# Altium footprint library pcb.PcbLib: 397 footprints (part 16 of 25)
Each footprint in its own frame and in the unit in brackets; x right, y up, seen from the top. Pads: shape width x height; smd on the part's side, far side on the other; paste and mask are expansions set on the pad; w line width, h text height; cw(c..) or ccw(c..) is an arc to the next point about the centre after c.
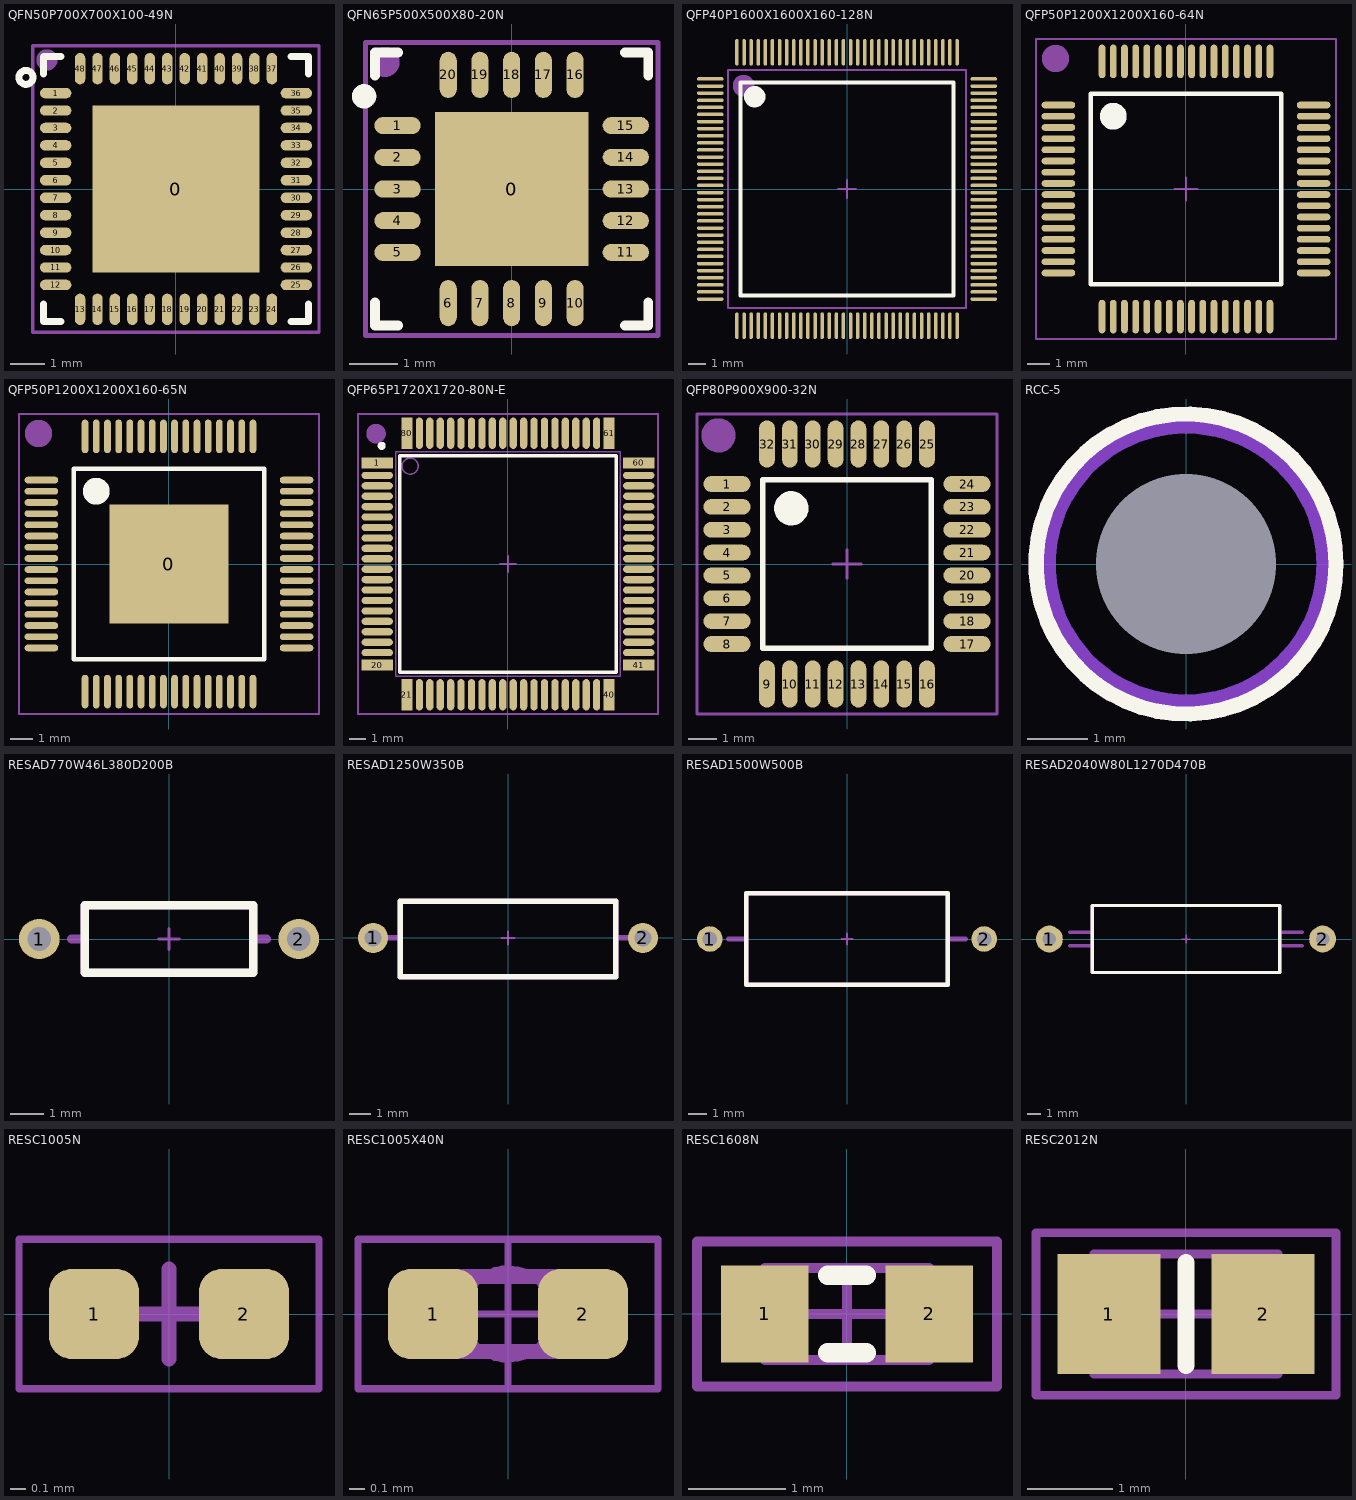
[diagram p15: the footprints below, top view; thin cyan lines are the x and y axes]

## QFN50P700X700X100-49N [mm] "QFN,0.50mm pitch,square;48 pin,7.00mm L X 7.00mm W X 1.0mm H body (w/thermal tab)"
height 0.8
pads (49):
  rect 4.8x4.8 smd paste-50: 0(0,0)
  oval 0.9x0.3 smd paste-0.03 mask+0.07: 1(-3.45,2.75) 2(-3.45,2.25) 3(-3.45,1.75) 4(-3.45,1.25) 5(-3.45,0.75) 6(-3.45,0.25) 7(-3.45,-0.25) 8(-3.45,-0.75) 9(-3.45,-1.25) 10(-3.45,-1.75) 11(-3.45,-2.25) 12(-3.45,-2.75) 25(3.45,-2.75) 26(3.45,-2.25) 27(3.45,-1.75) 28(3.45,-1.25) 29(3.45,-0.75) 30(3.45,-0.25) 31(3.45,0.25) 32(3.45,0.75) 33(3.45,1.25) 34(3.45,1.75) 35(3.45,2.25) 36(3.45,2.75)
  oval 0.3x0.9 smd paste-0.03 mask+0.07: 13(-2.75,-3.45) 14(-2.25,-3.45) 15(-1.75,-3.45) 16(-1.25,-3.45) 17(-0.75,-3.45) 18(-0.25,-3.45) 19(0.25,-3.45) 20(0.75,-3.45) 21(1.25,-3.45) 22(1.75,-3.45) 23(2.25,-3.45) 24(2.75,-3.45) 37(2.75,3.45) 38(2.25,3.45) 39(1.75,3.45) 40(1.25,3.45) 41(0.75,3.45) 42(0.25,3.45) 43(-0.25,3.45) 44(-0.75,3.45) 45(-1.25,3.45) 46(-1.75,3.45) 47(-2.25,3.45) 48(-2.75,3.45)
Top Overlay:
  circle w0.2: c-4.3,3.2 r0.2
  lines w0.2: -3.8,-3.3 -3.8,-3.8 -3.3,-3.8 ; -3.8,3.3 -3.8,3.8 -3.3,3.8 ; 3.3,-3.8 3.8,-3.8 3.8,-3.3 ; 3.3,3.8 3.8,3.8 3.8,3.3
Top Paste:
  region: -0.3,-2.3 -0.3,-0.3 -2.3,-0.3 -2.3,-2.3
  region: 2.3,-0.3 0.3,-0.3 0.3,-2.3 2.3,-2.3
  rectangle: 0.3,0.3 2.3,2.3
  rectangle: -2.3,0.3 -0.3,2.3
Mechanical 15:
  circle w0.406: c-3.7,3.7 r0.1
  lines w0.1: -0.3,0 0.3,0 ; 0,-0.3 0,0.3 ; -4.1,-4.1 -4.1,4.1 4.1,4.1 4.1,-4.1 -4.1,-4.1
  text ".Designator" at -3.8,-3.6 h1.02
3D body: height 1, standoff 0, extent -3.6,-3.6 3.6,3.6

## QFN65P500X500X80-20N [mm] "QFN, 20-Leads, Body 5.1x5.1mm (max), Pitch 0.65mm, IPC Medium Density"
height 0.8
pads (21):
  rect 3.15x3.15 smd paste-1000: 0(0,0)
  oval 0.95x0.35 smd: 1(-2.34,1.3) 2(-2.34,0.65) 3(-2.34,0) 4(-2.34,-0.65) 5(-2.34,-1.3) 11(2.34,-1.3) 12(2.34,-0.65) 13(2.34,0) 14(2.34,0.65) 15(2.34,1.3)
  oval 0.35x0.95 smd: 6(-1.3,-2.34) 7(-0.65,-2.34) 8(0,-2.34) 9(0.65,-2.34) 10(1.3,-2.34) 16(1.3,2.34) 17(0.65,2.34) 18(0,2.34) 19(-0.65,2.34) 20(-1.3,2.34)
Top Overlay:
  circle w0.25: c-3.025,1.9 r0.125
  lines w0.2: -2.8,-2.325 -2.8,-2.8 -2.325,-2.8 ; -2.8,2.325 -2.8,2.8 -2.325,2.8 ; 2.325,-2.8 2.8,-2.8 2.8,-2.325 ; 2.325,2.8 2.8,2.8 2.8,2.325
Top Paste:
  rectangle: -1.4,0.2 -0.2,1.4
  rectangle: 0.2,0.2 1.4,1.4
  rectangle: 0.2,-1.4 1.4,-0.2
  rectangle: -1.4,-1.4 -0.2,-0.2
Mechanical 15:
  circle w0.406: c-2.6,2.6 r0.1
  lines w0.1: -0.3,0 0.3,0 ; 0,-0.3 0,0.3 ; -3,-3 -3,3 3,3 3,-3 -3,-3
  text ".Designator" at -2.6,-2.4 h1.02
3D body: height 0.8, standoff 0.05, extent -2.55,-2.55 2.55,2.55

## QFP40P1600X1600X160-128N [mm]
height 1.6
pads (128):
  oval 1.5x0.2 smd: 1(-7.7,6.2) 2(-7.7,5.8) 3(-7.7,5.4) 4(-7.7,5) 5(-7.7,4.6) 6(-7.7,4.2) 7(-7.7,3.8) 8(-7.7,3.4) 9(-7.7,3) 10(-7.7,2.6) 11(-7.7,2.2) 12(-7.7,1.8) 13(-7.7,1.4) 14(-7.7,1) 15(-7.7,0.6) 16(-7.7,0.2) 17(-7.7,-0.2) 18(-7.7,-0.6) 19(-7.7,-1) 20(-7.7,-1.4) 21(-7.7,-1.8) 22(-7.7,-2.2) 23(-7.7,-2.6) 24(-7.7,-3) 25(-7.7,-3.4) 26(-7.7,-3.8) 27(-7.7,-4.2) 28(-7.7,-4.6) 29(-7.7,-5) 30(-7.7,-5.4) 31(-7.7,-5.8) 32(-7.7,-6.2) 65(7.7,-6.2) 66(7.7,-5.8) 67(7.7,-5.4) 68(7.7,-5) 69(7.7,-4.6) 70(7.7,-4.2) 71(7.7,-3.8) 72(7.7,-3.4) 73(7.7,-3) 74(7.7,-2.6) 75(7.7,-2.2) 76(7.7,-1.8) 77(7.7,-1.4) 78(7.7,-1) 79(7.7,-0.6) 80(7.7,-0.2) 81(7.7,0.2) 82(7.7,0.6) 83(7.7,1) 84(7.7,1.4) 85(7.7,1.8) 86(7.7,2.2) 87(7.7,2.6) 88(7.7,3) 89(7.7,3.4) 90(7.7,3.8) 91(7.7,4.2) 92(7.7,4.6) 93(7.7,5) 94(7.7,5.4) 95(7.7,5.8) 96(7.7,6.2)
  oval 0.2x1.5 smd: 33(-6.2,-7.7) 34(-5.8,-7.7) 35(-5.4,-7.7) 36(-5,-7.7) 37(-4.6,-7.7) 38(-4.2,-7.7) 39(-3.8,-7.7) 40(-3.4,-7.7) 41(-3,-7.7) 42(-2.6,-7.7) 43(-2.2,-7.7) 44(-1.8,-7.7) 45(-1.4,-7.7) 46(-1,-7.7) 47(-0.6,-7.7) 48(-0.2,-7.7) 49(0.2,-7.7) 50(0.6,-7.7) 51(1,-7.7) 52(1.4,-7.7) 53(1.8,-7.7) 54(2.2,-7.7) 55(2.6,-7.7) 56(3,-7.7) 57(3.4,-7.7) 58(3.8,-7.7) 59(4.2,-7.7) 60(4.6,-7.7) 61(5,-7.7) 62(5.4,-7.7) 63(5.8,-7.7) 64(6.2,-7.7) 97(6.2,7.7) 98(5.8,7.7) 99(5.4,7.7) 100(5,7.7) 101(4.6,7.7) 102(4.2,7.7) 103(3.8,7.7) 104(3.4,7.7) 105(3,7.7) 106(2.6,7.7) 107(2.2,7.7) 108(1.8,7.7) 109(1.4,7.7) 110(1,7.7) 111(0.6,7.7) 112(0.2,7.7) 113(-0.2,7.7) 114(-0.6,7.7) 115(-1,7.7) 116(-1.4,7.7) 117(-1.8,7.7) 118(-2.2,7.7) 119(-2.6,7.7) 120(-3,7.7) 121(-3.4,7.7) 122(-3.8,7.7) 123(-4.2,7.7) 124(-4.6,7.7) 125(-5,7.7) 126(-5.4,7.7) 127(-5.8,7.7) 128(-6.2,7.7)
Top Overlay:
  circle w0.6: c-5.2,5.2 r0.3
  lines w0.2: -6,-6 -6,6 6,6 6,-6 -6,-6
Mechanical 15:
  circle w1.016: c-5.828,5.828 r0.1
  lines w0.1: -0.5,0 0.5,0 ; 0,-0.5 0,0.5 ; -6.7,-6.7 -6.7,6.7 6.7,6.7 6.7,-6.7 -6.7,-6.7
  text ".Designator" at -5.4,1.4 h1.02
3D body: height 1.6, standoff 0, extent -7,-7 7,7

## QFP50P1200X1200X160-64N [mm] "Thin QFP, 64-Leads, Body 10x10mm, Pitch 0.5mm, IPC Medium Density"
height 1.6
pads (64):
  oval 1.5x0.3 smd: 1(-5.7,3.75) 2(-5.7,3.25) 3(-5.7,2.75) 4(-5.7,2.25) 5(-5.7,1.75) 6(-5.7,1.25) 7(-5.7,0.75) 8(-5.7,0.25) 9(-5.7,-0.25) 10(-5.7,-0.75) 11(-5.7,-1.25) 12(-5.7,-1.75) 13(-5.7,-2.25) 14(-5.7,-2.75) 15(-5.7,-3.25) 16(-5.7,-3.75) 33(5.7,-3.75) 34(5.7,-3.25) 35(5.7,-2.75) 36(5.7,-2.25) 37(5.7,-1.75) 38(5.7,-1.25) 39(5.7,-0.75) 40(5.7,-0.25) 41(5.7,0.25) 42(5.7,0.75) 43(5.7,1.25) 44(5.7,1.75) 45(5.7,2.25) 46(5.7,2.75) 47(5.7,3.25) 48(5.7,3.75)
  oval 0.3x1.5 smd: 17(-3.75,-5.7) 18(-3.25,-5.7) 19(-2.75,-5.7) 20(-2.25,-5.7) 21(-1.75,-5.7) 22(-1.25,-5.7) 23(-0.75,-5.7) 24(-0.25,-5.7) 25(0.25,-5.7) 26(0.75,-5.7) 27(1.25,-5.7) 28(1.75,-5.7) 29(2.25,-5.7) 30(2.75,-5.7) 31(3.25,-5.7) 32(3.75,-5.7) 49(3.75,5.7) 50(3.25,5.7) 51(2.75,5.7) 52(2.25,5.7) 53(1.75,5.7) 54(1.25,5.7) 55(0.75,5.7) 56(0.25,5.7) 57(-0.25,5.7) 58(-0.75,5.7) 59(-1.25,5.7) 60(-1.75,5.7) 61(-2.25,5.7) 62(-2.75,5.7) 63(-3.25,5.7) 64(-3.75,5.7)
Top Overlay:
  circle w0.6: c-3.25,3.25 r0.3
  lines w0.2: -4.25,-4.25 -4.25,4.25 4.25,4.25 4.25,-4.25 -4.25,-4.25
Mechanical 15:
  circle w1.016: c-5.828,5.828 r0.1
  lines w0.1: -0.5,0 0.5,0 ; 0,-0.5 0,0.5 ; -6.7,-6.7 -6.7,6.7 6.7,6.7 6.7,-6.7 -6.7,-6.7
  text ".Designator" at -5.4,1.4 h1.02
3D body: height 1.6, standoff 0, extent -5,-5 5,5

## QFP50P1200X1200X160-65N [mm] "Thin QFP, 64-Leads, Body 10x10mm, Pitch 0.5mm, IPC Medium Density"
height 1.6
pads (65):
  rect 5.3x5.3 smd paste-1000: 0(0,0)
  oval 1.5x0.3 smd: 1(-5.7,3.75) 2(-5.7,3.25) 3(-5.7,2.75) 4(-5.7,2.25) 5(-5.7,1.75) 6(-5.7,1.25) 7(-5.7,0.75) 8(-5.7,0.25) 9(-5.7,-0.25) 10(-5.7,-0.75) 11(-5.7,-1.25) 12(-5.7,-1.75) 13(-5.7,-2.25) 14(-5.7,-2.75) 15(-5.7,-3.25) 16(-5.7,-3.75) 33(5.7,-3.75) 34(5.7,-3.25) 35(5.7,-2.75) 36(5.7,-2.25) 37(5.7,-1.75) 38(5.7,-1.25) 39(5.7,-0.75) 40(5.7,-0.25) 41(5.7,0.25) 42(5.7,0.75) 43(5.7,1.25) 44(5.7,1.75) 45(5.7,2.25) 46(5.7,2.75) 47(5.7,3.25) 48(5.7,3.75)
  oval 0.3x1.5 smd: 17(-3.75,-5.7) 18(-3.25,-5.7) 19(-2.75,-5.7) 20(-2.25,-5.7) 21(-1.75,-5.7) 22(-1.25,-5.7) 23(-0.75,-5.7) 24(-0.25,-5.7) 25(0.25,-5.7) 26(0.75,-5.7) 27(1.25,-5.7) 28(1.75,-5.7) 29(2.25,-5.7) 30(2.75,-5.7) 31(3.25,-5.7) 32(3.75,-5.7) 49(3.75,5.7) 50(3.25,5.7) 51(2.75,5.7) 52(2.25,5.7) 53(1.75,5.7) 54(1.25,5.7) 55(0.75,5.7) 56(0.25,5.7) 57(-0.25,5.7) 58(-0.75,5.7) 59(-1.25,5.7) 60(-1.75,5.7) 61(-2.25,5.7) 62(-2.75,5.7) 63(-3.25,5.7) 64(-3.75,5.7)
Top Overlay:
  circle w0.6: c-3.25,3.25 r0.3
  lines w0.2: -4.25,-4.25 4.25,-4.25 4.25,4.25 -4.25,4.25 -4.25,-4.25
Top Paste:
  region: -0.2,0.2 -0.2,2.3 -2.3,2.3 -2.3,0.2
  region: -0.2,-0.2 -2.3,-0.2 -2.3,-2.3 -0.2,-2.3
  region: 0.2,-0.2 0.2,-2.3 2.3,-2.3 2.3,-0.2
  rectangle: 0.2,0.2 2.3,2.3
Mechanical 15:
  circle w1.016: c-5.828,5.828 r0.1
  lines w0.1: -0.5,0 0.5,0 ; 0,-0.5 0,0.5 ; -6.7,-6.7 6.7,-6.7 6.7,6.7 -6.7,6.7 -6.7,-6.7
  text ".Designator" at -5.4,1.4 h1.02
3D body: height 1.6, standoff 0, extent -5,-5 5,5

## QFP65P1720X1720-80N-E [mm] "QFP, 80-Leads, Body 14 x 14 mm, Pitch 0.65mm, IPC Medium Density"
height 2.45
pads (80):
  rect 1.95x0.7 smd: 1(-8.15,6.3) 20(-8.15,-6.3) 41(8.15,-6.3) 60(8.15,6.3)
  oval 1.95x0.45 smd: 2(-8.15,5.525) 3(-8.15,4.875) 4(-8.15,4.225) 5(-8.15,3.575) 6(-8.15,2.925) 7(-8.15,2.275) 8(-8.15,1.625) 9(-8.15,0.975) 10(-8.15,0.325) 11(-8.15,-0.325) 12(-8.15,-0.975) 13(-8.15,-1.625) 14(-8.15,-2.275) 15(-8.15,-2.925) 16(-8.15,-3.575) 17(-8.15,-4.225) 18(-8.15,-4.875) 19(-8.15,-5.525) 42(8.15,-5.525) 43(8.15,-4.875) 44(8.15,-4.225) 45(8.15,-3.575) 46(8.15,-2.925) 47(8.15,-2.275) 48(8.15,-1.625) 49(8.15,-0.975) 50(8.15,-0.325) 51(8.15,0.325) 52(8.15,0.975) 53(8.15,1.625) 54(8.15,2.275) 55(8.15,2.925) 56(8.15,3.575) 57(8.15,4.225) 58(8.15,4.875) 59(8.15,5.525)
  rect 0.7x1.95 smd: 21(-6.3,-8.15) 40(6.3,-8.15) 61(6.3,8.15) 80(-6.3,8.15)
  oval 0.45x1.95 smd: 22(-5.525,-8.15) 23(-4.875,-8.15) 24(-4.225,-8.15) 25(-3.575,-8.15) 26(-2.925,-8.15) 27(-2.275,-8.15) 28(-1.625,-8.15) 29(-0.975,-8.15) 30(-0.325,-8.15) 31(0.325,-8.15) 32(0.975,-8.15) 33(1.625,-8.15) 34(2.275,-8.15) 35(2.925,-8.15) 36(3.575,-8.15) 37(4.225,-8.15) 38(4.875,-8.15) 39(5.525,-8.15) 62(5.525,8.15) 63(4.875,8.15) 64(4.225,8.15) 65(3.575,8.15) 66(2.925,8.15) 67(2.275,8.15) 68(1.625,8.15) 69(0.975,8.15) 70(0.325,8.15) 71(-0.325,8.15) 72(-0.975,8.15) 73(-1.625,8.15) 74(-2.275,8.15) 75(-2.925,8.15) 76(-3.575,8.15) 77(-4.225,8.15) 78(-4.875,8.15) 79(-5.525,8.15)
Top Overlay:
  circle w0.25: c-7.872,7.366 r0.125
  lines w0.2: -6.75,-6.75 -6.75,6.75 6.75,6.75 6.75,-6.75 -6.75,-6.75
Mechanical 13:
  circle w0.1: c-6.1,6.1 r0.5
  lines w0.1: -7,-7 -7,7 7,7 7,-7 -7,-7
Mechanical 15:
  circle w1.016: c-8.228,8.128 r0.1
  lines w0.1: -0.5,0 0.5,0 ; 0,-0.5 0,0.5 ; -9.35,-9.35 -9.35,9.35 9.35,9.35 9.35,-9.35 -9.35,-9.35
  text ".Designator" at -4.775,1.727 h1.02
3D body: height 2.45, standoff 0, extent -7,-7 7,7

## QFP80P900X900-32N [mm] "32-Pin Quad Flat Pack 0.8 mm Pitch"
height 1.7
pads (32):
  oval 1.65x0.55 smd: 1(-4.2,2.8) 2(-4.2,2) 3(-4.2,1.2) 4(-4.2,0.4) 5(-4.2,-0.4) 6(-4.2,-1.2) 7(-4.2,-2) 8(-4.2,-2.8) 17(4.2,-2.8) 18(4.2,-2) 19(4.2,-1.2) 20(4.2,-0.4) 21(4.2,0.4) 22(4.2,1.2) 23(4.2,2) 24(4.2,2.8)
  oval 0.55x1.65 smd: 9(-2.8,-4.2) 10(-2,-4.2) 11(-1.2,-4.2) 12(-0.4,-4.2) 13(0.4,-4.2) 14(1.2,-4.2) 15(2,-4.2) 16(2.8,-4.2) 25(2.8,4.2) 26(2,4.2) 27(1.2,4.2) 28(0.4,4.2) 29(-0.4,4.2) 30(-1.2,4.2) 31(-2,4.2) 32(-2.8,4.2)
Top Overlay:
  circle w0.6: c-1.95,1.95 r0.3
  lines w0.2: -2.95,-2.95 2.95,-2.95 2.95,2.95 -2.95,2.95 -2.95,-2.95
Mechanical 15:
  circle w0.6: c-4.5,4.5 r0.3
  lines w0.1: -0.5,0 0.5,0 ; 0,-0.5 0,0.5 ; -5.25,-5.25 5.25,-5.25 5.25,5.25 -5.25,5.25 -5.25,-5.25
  text ".Designator" at -1.775,-1.973 h1.02
3D body: height 1.7, standoff 0, extent -3.5,-3.5 3.5,3.5

## RCC-5 [mm]
pads (1):
  round 0 hole 3 unplated paste-25.4 mask-254: 0(0,0)
Top Layer keep-out:
  circle w0.254: c0,0 r2.5
Bottom Layer keep-out:
  circle w0.254: c0,0 r2.3
Top Overlay:
  circle w0.254: c0,0 r2.5
3D body: height -1.6, standoff -6.6, extent -1.984,-1.892 2,2.1
3D body: height 2, standoff 0, extent -2,-1.896 1.984,2.096

## RESAD770W46L380D200B [mm]
height 2
pads (2):
  round 1.2 hole 0.7: 1(-3.85,0) 2(3.85,0)
Top Overlay:
  lines w0.254: -2.5,-1 -2.5,1 2.5,1 2.5,-1 -2.5,-1
Mechanical 15:
  lines w0.1: -0.3,0 0.3,0 ; 0,-0.3 0,0.3
  lines w0.254: -2.9,0 -2.5,0 ; 2.5,0 2.9,0 ; -2.5,-1 -2.5,1 2.5,1 2.5,-1 -2.5,-1
  text ".Designator" at -2,-0.6 h1.02
3D body: height 2.19, standoff 0.2, extent -2.5,-1 2.5,0.996

## RESAD1250W350B [mm]
height 5
pads (2):
  round 1.4 hole 0.8: 1(-6.25,0) 2(6.25,0)
Top Overlay:
  lines w0.254: -5,-1.8 -5,1.7 5,1.7 5,-1.8 -5,-1.8
Mechanical 15:
  lines w0.1: -0.3,0 0.3,0 ; 0,-0.3 0,0.3
  lines w0.254: -5.5,0 -5,0 ; 5,0 5.5,0 ; -5,-1.8 -5,1.7 5,1.7 5,-1.8 -5,-1.8
  text ".Designator" at -2,-0.6 h1.02
3D body: height 3.69, standoff 0.2, extent -5,-1.797 5,1.7

## RESAD1500W500B [mm]
height 5
pads (2):
  round 1.4 hole 0.8: 1(-7.5,0) 2(7.5,0)
Top Overlay:
  lines w0.254: -5.5,-2.5 5.5,-2.5 5.5,2.5 -5.5,2.5 -5.5,-2.5
Mechanical 15:
  lines w0.1: -0.3,0 0.3,0 ; 0,-0.3 0,0.3
  lines w0.254: -6.5,0 -5.5,0 ; 5.5,0 6.5,0 ; -5.5,-2.5 5.5,-2.5 5.5,2.5 -5.5,2.5 -5.5,-2.5
  text ".Designator" at -2,-0.6 h1.02
3D body: height 5.19, standoff 0.2, extent -5.5,-2.497 5.5,2.5

## RESAD2040W80L1270D470B [mm]
height 5
pads (2):
  round 2 hole 1: 1(-10.2,0) 2(10.2,0)
Top Overlay:
  lines w0.254: -7,-2.5 7,-2.5 7,2.5 -7,2.5 -7,-2.5
Mechanical 15:
  lines w0.1: -0.3,0 0.3,0 ; 0,-0.3 0,0.3
  lines w0.254: -8.7,-0.5 -7,-0.5 ; -8.7,0.5 -7,0.5 ; 7,-0.5 8.7,-0.5 ; 7,0.5 8.7,0.5 ; -7,-2.5 7,-2.5 7,2.5 -7,2.5 -7,-2.5
  text ".Designator" at -7.4,-5.6 h1.02
3D body: height 5.48, standoff 0.5, extent -7,-2.5 7,2.49

## RESC1005N [mm] "Chip Capacitor, Body 1.0x0.5mm, IPC Medium Density"
height 0.6
pads (2):
  rrect50% 0.6x0.6 smd: 1(-0.5,0) 2(0.5,0)
Mechanical 15:
  lines w0.05: -1,-0.5 -1,0.5 1,0.5 1,-0.5 -1,-0.5
  lines w0.1: -0.3,0 0.3,0 ; 0,-0.3 0,0.3
  text ".Designator" at -0.9,-0.4 h0.3
3D body: height 0.5, standoff 0, extent -0.5,-0.25 0.5,0.25

## RESC1005X40N [mm] "Chip Capacitor, Body 1.0x0.5mm, IPC Medium Density"
height 0.4
pads (2):
  rrect50% 0.6x0.6 smd: 1(-0.5,0) 2(0.5,0)
Mechanical 13:
  lines w0.1: -0.5,-0.25 0.5,-0.25 0.5,0.25 -0.5,0.25 -0.5,-0.25
Mechanical 15:
  circle w0.05: c0,0 r0.3
  lines w0.05: -0.475,0 0.475,0 ; 0,-0.475 0,0.475 ; -1,-0.5 -1,0.5 1,0.5 1,-0.5 -1,-0.5
  text ".Designator" at -0.9,-0.4 h0.3
3D body: height 0.4, standoff 0, extent -0.5,-0.25 0.5,0.25

## RESC1608N [mm] "Chip Resistor, Body 1.6x0.8mm, IPC Medium Density"
height 0.6
pads (2):
  rect 0.9x1 smd: 1(-0.85,0) 2(0.85,0)
Top Overlay:
  lines w0.2: -0.2,-0.4 0.2,-0.4 ; -0.2,0.4 0.2,0.4
Mechanical 13:
  lines w0.1: -0.85,-0.475 0.85,-0.475 0.85,0.475 -0.85,0.475 -0.85,-0.475
Mechanical 15:
  lines w0.1: -0.475,0 0.475,0 ; 0,-0.475 0,0.475 ; -1.55,-0.75 1.55,-0.75 1.55,0.75 -1.55,0.75 -1.55,-0.75
  text ".Designator" at -1.372,-0.61 h0.51
3D body: height 0.6, standoff 0, extent -0.85,-0.475 0.85,0.475

## RESC2012N [mm] "Chip Resistor, Body 2.0x1.3mm, IPC Medium Density"
height 0.65
pads (2):
  rect 1.2x1.4 smd: 1(-0.9,0) 2(0.9,0)
Top Overlay:
  lines w0.2: 0,-0.6 0,0.6
Mechanical 13:
  lines w0.1: -1.075,-0.7 -1.075,0.7 1.075,0.7 1.075,-0.7 -1.075,-0.7
Mechanical 15:
  lines w0.1: -0.5,0 0.5,0 ; 0,-0.5 0,0.5 ; -1.75,-0.95 -1.75,0.95 1.75,0.95 1.75,-0.95 -1.75,-0.95
  text ".Designator" at -1.575,-0.711 h0.51
3D body: height 0.65, standoff 0, extent -1.075,-0.7 1.075,0.7